# Altium footprint library BARKO_PCBLIB.PcbLib: 531 footprints (part 22 of 34)
Each footprint in its own frame and in the unit in brackets; x right, y up, seen from the top. Pads: shape width x height; smd on the part's side, far side on the other; paste and mask are expansions set on the pad; w line width, h text height; cw(c..) or ccw(c..) is an arc to the next point about the centre after c.
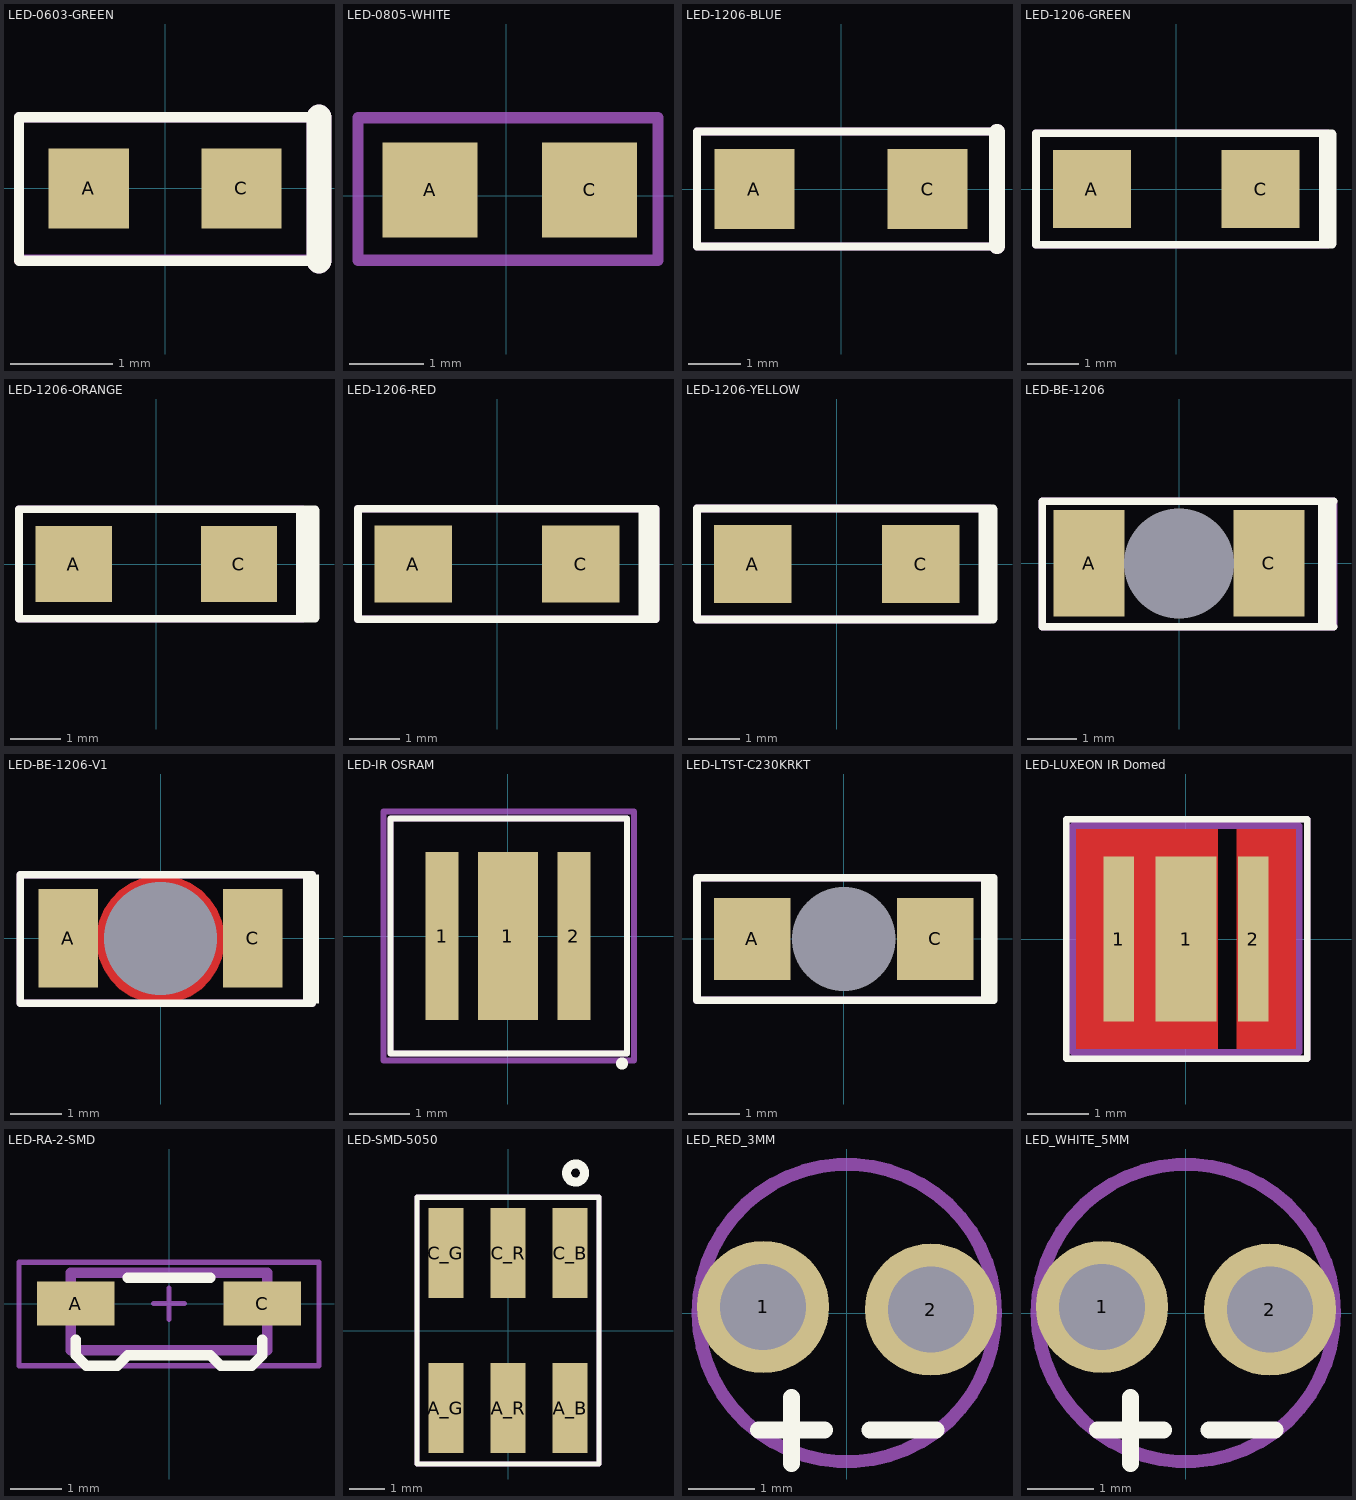
[diagram p21: the footprints below, top view; thin cyan lines are the x and y axes]

## LED-0603-GREEN [mil]
pads (2):
  rect 31x31 smd: A(-29.5,0) C(29.5,0)
Top Overlay:
  lines w4: 59.52,-28 -56.5,-28 -56.5,27.56 59.52,27.56
  lines w9.84: 59.52,-28 59.52,27.56
ASM Top:
  lines w4: 59.52,-27.56 -56.5,-27.56 -56.5,27.56 59.52,27.56
  lines w9.84: 59.52,-28 59.52,27.56
  text ".designator" at -44.5,-15 h31.5
3D body "LED_0603_G.STEP": height 23.62, standoff -0.08, extent -31.99,-15.74 31.01,15.75

## LED-0805-WHITE [mil]
pads (2):
  rect 50x50 smd mask+0: A(-40,3) C(44,3)
ASM Top:
  region: 80,41
  lines w5.91: 80,-34 80,41
  lines w6: 80,-34 -78,-34 -78,41 80,41
  text ".designator" at -59,-17 h31.5
3D body "LED SMD0805.STEP": height 33.72, standoff 0.5, extent -39.6,-13.68 41.6,22

## LED-1206-BLUE [mil]
pads (2):
  rect 60x60 smd: A(-65,0) C(65,0)
Top Overlay:
  lines w6: 117,-43 -108,-43 -108,43 117,43
  lines w11.81: 117,-43 117,43
ASM Top:
  lines w6: 117,-43 -108,-43 -108,43 117,43
  lines w11.81: 117,-43 117,43
  text ".designator" at -58,-8 h31.5
3D body "led_blue_1206.STEP": height 43.8, standoff 0.5, extent -62.38,-31.49 64.39,31.5

## LED-1206-GREEN [mil]
pads (2):
  rect 60x60 smd: A(-65,0) C(65,0)
Top Overlay:
  region: 123,43 110,43 110,-43 123,-43
  lines w6: 120,-43 -108,-43 -108,43 120,43
ASM Top:
  lines w6: -108,-43 -108,43 116,43 116,-7 116,-41 116,-43 -108,-43
  text ".designator" at -90,-24 h31.5
3D body "led_green_1206.STEP": height 43.8, standoff 0.5, extent -62.38,-31.49 64.39,31.5

## LED-1206-ORANGE [mil]
pads (2):
  rect 60x60 smd: A(-65,0) C(65,0)
Top Overlay:
  region: 128,43 110,43 110,-43 128,-43
  lines w6: 125,-43 -108,-43 -108,43 125,43
ASM Top:
  lines w6: -108,-43 -108,43 115,43 115,28 115,-6 115,-43 -108,-43
  text ".designator" at -43,-11 h31.5
3D body "led_orange_1206.STEP": height 43.8, standoff 0.5, extent -62.38,-31.49 64.39,31.5

## LED-1206-RED [mil]
pads (2):
  rect 60x60 smd: A(-65,0) C(65,0)
Top Overlay:
  region: 125,43 110,43 110,-43 125,-43
  lines w6: -108,-43 -108,43 123,43 123,40 123,-34 123,-43 -108,-43
ASM Top:
  lines w6: -108,-43 -108,43 123,43 123,40 123,6 123,-43 -108,-43
  text ".designator" at -41,-19 h31.5
3D body "led_red_1206.STEP": height 43.8, standoff 0.5, extent -62.38,-31.49 64.39,31.5

## LED-1206-YELLOW [mil]
pads (2):
  rect 60x60 smd: A(-65,0) C(65,0)
Top Overlay:
  region: 124,43 110,43 110,-43 124,-43
  lines w6: 121.01,-43 -108,-43 -108,43 121.01,43
ASM Top:
  lines w5.91: 118,-43 118,43
  lines w6: 118,-43 -108,-43 -108,43 118,43
  text ".designator" at -91,-25 h31.5
3D body "led_yellow_1206.STEP": height 43.8, standoff 0.5, extent -62.38,-31.49 64.39,31.5

## LED-BE-1206 [mil]
pads (3):
  round 1 hole 87 unplated: 48(0,0)
  rect 56x84 smd mask+1.97: A(-71,0) C(71,0)
Top Overlay:
  region: 124,49 110,49 110,-50 124,-50
  lines w6: 122.21,-50 -108,-50 -108,49 122.21,49
ASM Top:
  lines w5.91: 122.21,-50 122.21,49
  lines w6: 122.21,-50 -108,-50 -108,49 122.21,49
  text ".designator" at -94,-37 h31.5
3D body "bottom entry.STEP": height 10.38, standoff -31, extent -61,-33 64.98,30

## LED-BE-1206-V1 [mil]
pads (3):
  round 1 hole 87 unplated: 1(0,0)
  rect 46x76 smd mask+1.97: A(-71,0) C(71,0)
Top Layer:
  pour cut-out: -49.04,-1 -49.04,-5.83 -47.16,-15.3 -43.46,-24.23 -38.09,-32.26 -31.26,-39.09 -23.23,-44.46 -14.3,-48.16 -4.83,-50.04 0,-50.04 4.83,-50.04 14.3,-48.16 23.23,-44.46 31.26,-39.09 38.09,-32.26 43.46,-24.23 47.16,-15.3 49.04,-5.83 49.04,-1 49.04,3.83 47.16,13.3 43.46,22.23 38.09,30.26 31.26,37.09 23.23,42.46 14.3,46.16 4.83,48.04 0,48.04 -4.83,48.04 -14.3,46.16 -23.23,42.46 -31.26,37.09 -38.09,30.26 -43.46,22.23 -47.16,13.3 -49.04,3.83
Top Overlay:
  region: 122.05,49 110,49 110,-50 122.05,-50
  lines w6: 116.83,-50 -108,-50 -108,49 116.83,49
ASM Top:
  lines w5.91: 116.83,-50 116.83,49
  lines w6: 116.83,-50 -108,-50 -108,49 116.83,49
3D body "bottom entry.STEP": height 10.38, standoff -31, extent -61,-33 64.98,30

## LED-IR OSRAM [mm] "LUXEON IR Domed (90 degree dome in 3D)"
height 0.7
pads (3):
  rect 0.55x2.8 smd paste-1 mask+0: 1(-1.1,0)
  rect 1x2.8 smd paste-5 mask+0: 1(0,0)
  rect 0.55x2.8 smd paste-2 mask+0: 2(1.1,0)
Top Overlay:
  circle w0.1: c1.9,-2.125 r0.05
  lines w0.1: -1.956,-1.956 1.981,-1.956 1.981,1.956 -1.956,1.956 -1.956,-1.956
Top Paste:
  rectangle: 0.875,-1.25 1.325,1.25
  rectangle: -0.45,0.15 0.45,1.3
  rectangle: -1.325,-1.25 -0.925,1.35
  region: 0.45,-0.15 -0.45,-0.15 -0.45,-1.3 0.45,-1.3
Mechanical 15:
  lines w0.1: -0.329,0 0.306,0 ; 0,-0.305 0,0.33 ; -2.075,-2.075 -2.075,2.075 2.1,2.075 2.1,-2.075 -2.075,-2.075
ASM Top:
  lines w0.1: -1.956,-1.956 1.981,-1.956 1.981,1.956 -1.956,1.956 -1.956,-1.956
  text ".designator" at -0.66,-0.152 h0.8
3D body "SFH_4717AS_A01_20180620_geometry.STEP": height 2.67, standoff 0.01, extent -1.925,-1.925 1.925,1.925

## LED-LTST-C230KRKT [mil]
pads (3):
  rect 1x1 hole 80 unplated: 96(0,0)
  rect 59x63 smd mask+1.97: A(-70.5,0) C(70.5,0)
Top Overlay:
  region: 118.11,47.24 105.86,47.24 105.86,-47.24 118.11,-47.24
  lines w6: 115.4,-47.24 -113,-47.24 -113,47.24 115.4,47.24
ASM Top:
  lines w5.91: 110.57,-47.24 110.57,47.24
  lines w6: 110.57,-47.24 -113,-47.24 -113,47.24 110.57,47.24
  text ".designator" at -95,-27 h31.5
3D body "LTST-C230KRKT.STEP": height 12.31, standoff -31.39, extent -64.35,-32 64,31

## LED-LUXEON IR Domed [mm] "LUXEON IR Domed (90 degree dome in 3D)"
height 0.7
pads (3):
  rect 0.5x2.7 smd paste-1 mask+0: 1(-1.1,0)
  rect 1x2.7 smd paste-5 mask+0: 1(0,0)
  rect 0.5x2.7 smd paste-2 mask+0: 2(1.1,0)
Top Layer:
  rectangle: 0.825,-1.8 1.8,1.8
  rectangle: -0.41,-1.4 0.41,-1.29
  region: 0.41,1.4 -0.41,1.4 -0.41,1.29 0.41,1.29
  rectangle: -1.8,-1.8 0.525,1.8
Top Overlay:
  lines w0.1: -1.956,-1.956 -1.956,1.956 1.981,1.956 1.981,-1.956 -1.956,-1.956
Top Paste:
  rectangle: -1.325,-1.25 -0.875,1.25
  rectangle: -0.45,-1.25 0.45,1.25
  rectangle: 0.875,-1.25 1.325,1.25
Mechanical 15:
  lines w0.1: -0.329,0 0.306,0 ; 0,-0.305 0,0.33 ; -1.85,-1.85 1.85,-1.85 1.85,1.85 -1.85,1.85 -1.85,-1.85
ASM Top:
  lines w0.1: -1.956,-1.956 -1.956,1.956 1.981,1.956 1.981,-1.956 -1.956,-1.956
  text ".designator" at -0.66,-0.152 h0.8
3D body "LUXEON IR Domed Line 90 Deg 00000463 20161011.STEP": height 2.77, standoff 0, extent -1.85,-1.85 1.85,1.85

## LED-RA-2-SMD [mm]
pads (2):
  rect 1.5x0.85 smd: A(-1.8,0) C(1.8,0)
Top Overlay:
  lines w0.2: -1.8,-0.7 -1.8,-0.997 -1.597,-1.2 -1,-1.2 -0.8,-1 0,-1 0.8,-1 1,-1.2 1.6,-1.2 1.8,-1 1.8,-0.7 ; -0.8,0.5 0.8,0.5
Mechanical 15:
  lines w0.1: -0.3,0 0.3,0 ; 0,-0.3 0,0 0,0.3 ; -2.9,-1.2 2.9,-1.2 2.9,0.8 -2.9,0.8 -2.9,-1.2
ASM Top:
  lines w0.2: -1.9,-0.9 1.9,-0.9 1.9,0.6 -1.9,0.6 -1.9,-0.9
  text ".designator" at -0.5,-0.5 h0.8
3D body "CUW_Y3SH_121213_geometry.STEP": height 0.61, standoff 0.01, extent -1.9,-1 1.9,0

## LED-SMD-5050 [mil]
pads (6):
  rect 39x100 smd: A_B(69,-86) A_G(-69,-86) A_R(0,-86) C_B(69,86) C_G(-69,86) C_R(0,86)
Top Overlay:
  circle w10: c75,175 r10
  lines w6: -101,-148 101,-148 101,148 -101,148 -101,-148
ASM Top:
  lines w6: -101,-148 101,-148 101,148 -101,148 -101,-148
  text ".designator" at -65,-13 h31.5
3D body "smd_led_5050.STEP": height 62.99, standoff 0, extent -98.85,-104.66 98,104

## LED_RED_3MM [mm]
height 8.8
pads (2):
  round 2 hole 1.3: 1(-1.269,0.091) 2(1.271,0.051)
Top Overlay:
  lines w0.254: -1.34,-1.77 -0.34,-1.77 ; -0.84,-2.28 -0.84,-1.28 ; 0.35,-1.77 1.35,-1.77
ASM Top:
  circle w0.2: c0,0 r2.25
  text ".designator" at -0.7,-0.2 h0.8
3D body: height 0.25, standoff 0, extent 0,0 0,0
3D body "STEP-WL-TMRC-3mm-wos-rev1.stp": height 5.31, standoff -26.39, extent -1.9,-1.85 1.67,2

## LED_WHITE_5MM [mm]
height 8.8
pads (2):
  round 2 hole 1.3: 1(-1.269,0.091) 2(1.271,0.051)
Top Overlay:
  lines w0.254: -1.34,-1.77 -0.34,-1.77 ; -0.84,-2.28 -0.84,-1.28 ; 0.35,-1.77 1.35,-1.77
ASM Top:
  circle w0.2: c0,0 r2.25
  text ".designator" at -0.7,-0.2 h0.8
3D body "User Library-5MM-LED-CLEAR.STEP": height 8.61, standoff -7.36, extent -2.615,-2.82 2.835,3.08
3D body: height 0.25, standoff 0, extent 0,0 0,0